# Altium schematic symbol library Minh_Lib.SchLib: 619 symbols (part 4 of 4) (continued)
## TAJB106K020RNJ
designator C?  Supplier Part Number 1: 1354062
钽电容 10uF ±10% 20V 2.1Ω B型3528; Manufacturer: Kyocera AVX; Manufacturer Part Number: TAJB106K020RNJ; Dielectric Material: Tantalum; Tolerance: 20%; ESR (Equivalent Series Resistance): 2.1R; Leakage Current: 2uA; Polarity: Polar; Dissipation Factor: 6%; Q Factor: 6; Supplier 1: RSComponents; RoHS: Yes; Category: Tantalum Capacitors; Stock 1: 240; Pricing 1: 2000=0.12400, 6000=0.11200 (USD); Mount: Surface Mount,PCB; Case/Package: 1210; Number of Pins: 2; Case Code (Metric): 3528; Case Code (Imperial): 1210; Min Operating Temperature: -55°C; Max Operating Temperature: 125°C; Capacitance: 10uF; Voltage Rating (DC): 20V; Voltage Rating: 20V; Package Quantity: 1; Packaging: Tape and Reel; Termination: SMD/SMT; Voltage: 20V; Features: General Purpose; Series: TAJ; Construction: Flat; Length: 3.5mm; Width: 2.8mm; Height: 1.9mm; Depth: 2.8mm; Height - Seated (Max): 0.083inch; Radiation Hardening: No; Lead Free: Lead Free; RoHS Compliant: Yes; REACH SVHC: No SVHC; ComponentLink1URL: https://datasheet.ciiva.com/11793/0900766b80ccdc61-11793072.pdf?src-supplier=RSComponents; ComponentLink1Description: https://datasheet.ciiva.com/11793/0900766b80ccdc61-11793072.pdf?src-supplier=RSComponents; ComponentLink2URL: https://datasheet.ciiva.com/26341/559425-da-01-en-tacc-b-3-2-mm-x-2-5-mm-x-1-9-mm-10-uf-26341766.pdf?src-supplier=Conrad; ComponentLink2Description: https://datasheet.ciiva.com/26341/559425-da-01-en-tacc-b-3-2-mm-x-2-5-mm-x-1-9-mm-10-uf-26341766.pdf?src-supplier=Conrad; ComponentLink3URL: https://datasheet.ciiva.com/26787/tajb106k020rnj-26787086.pdf?src-supplier=IIIC; ComponentLink3Description: https://datasheet.ciiva.com/26787/tajb106k020rnj-26787086.pdf?src-supplier=IIIC; ComponentLink4URL: https://datasheet.ciiva.com/18710/taj-eng-18710633.pdf?src-supplier=Distrelec; ComponentLink4Description: https://datasheet.ciiva.com/18710/taj-eng-18710633.pdf?src-supplier=Distrelec; ComponentLink5URL: https://datasheet.ciiva.com/16485/taj-16485899.pdf?src-supplier=Avnet+Asia; ComponentLink5Description: https://datasheet.ciiva.com/16485/taj-16485899.pdf?src-supplier=Avnet+Asia; ComponentLink6URL: https://datasheet.ciiva.com/16393/taj-16393850.pdf?src-supplier=Future+Electronics; ComponentLink6Description: https://datasheet.ciiva.com/16393/taj-16393850.pdf?src-supplier=Future+Electronics; ComponentLink7URL: https://datasheet.ciiva.com/3004/taj-3004427.pdf?src-supplier=Avnet; ComponentLink7Description: https://datasheet.ciiva.com/3004/taj-3004427.pdf?src-supplier=Avnet; ComponentLink8URL: https://datasheet.ciiva.com/14586/70001050-14586940.pdf?src-supplier=Allied+Electronics; ComponentLink8Description: https://datasheet.ciiva.com/14586/70001050-14586940.pdf?src-supplier=Allied+Electronics; ComponentLink9URL: https://datasheet.ciiva.com/14602/70001050-14602487.pdf?src-supplier=Allied+Electronics; ComponentLink9Description: https://datasheet.ciiva.com/14602/70001050-14602487.pdf?src-supplier=Allied+Electronics; ComponentLink10URL: https://datasheet.ciiva.com/12882/taj-27497-12882702.pdf?src-supplier=Mouser; ComponentLink10Description: https://datasheet.ciiva.com/12882/taj-27497-12882702.pdf?src-supplier=Mouser; ComponentLink11URL: https://datasheet.ciiva.com/263/taj-263492.pdf?src-supplier=Digi-Key; ComponentLink11Description: https://datasheet.ciiva.com/263/taj-263492.pdf?src-supplier=Digi-Key; ComponentLink12URL: https://datasheet.ciiva.com/263/taj-263491.pdf?src-supplier=Digi-Key; ComponentLink12Description: https://datasheet.ciiva.com/263/taj-263491.pdf?src-supplier=Digi-Key; ComponentLink13URL: https://datasheet.ciiva.com/7730/1826076-7730728.pdf?src-supplier=Element14; ComponentLink13Description: https://datasheet.ciiva.com/7730/1826076-7730728.pdf?src-supplier=Element14; ComponentLink14URL: https://datasheet.ciiva.com/5936/13070-5936843.pdf?src-supplier=Farnell; ComponentLink14Description: https://datasheet.ciiva.com/5936/13070-5936843.pdf?src-supplier=Farnell; ComponentLink15URL: https://datasheet.ciiva.com/7730/1826076-7730729.pdf?src-supplier=Element14; ComponentLink15Description: https://datasheet.ciiva.com/7730/1826076-7730729.pdf?src-supplier=Element14; ComponentLink16URL: https://datasheet.ciiva.com/7730/1826076-7730727.pdf?src-supplier=Element14; ComponentLink16Description: https://datasheet.ciiva.com/7730/1826076-7730727.pdf?src-supplier=Element14; ComponentLink17URL: https://datasheet.ciiva.com/7730/1826076-7730726.pdf?src-supplier=Element14; ComponentLink17Description: https://datasheet.ciiva.com/7730/1826076-7730726.pdf?src-supplier=Element14; ComponentLink18URL: https://datasheet.ciiva.com/263/taj-263490.pdf?src-supplier=Digi-Key; ComponentLink18Description: https://datasheet.ciiva.com/263/taj-263490.pdf?src-supplier=Digi-Key; ComponentLink19URL: https://datasheet.ciiva.com/3004/taj-3004426.pdf?src-supplier=Avnet; ComponentLink19Description: https://datasheet.ciiva.com/3004/taj-3004426.pdf?src-supplier=Avnet
footprint Capacitor/Tantalum  - SMD3528/B - AVX (1210/3528-15 SIZE B-AVX)
pins: 1, 2
text: +

## TAJB106K025RNJ
designator C?  Supplier Part Number 1: 1360159
钽电容 10uF ±10% 25V 2.5Ω B型3528; Manufacturer: Kyocera AVX; Manufacturer Part Number: TAJB106K025RNJ; ESR (Equivalent Series Resistance): 2.5R; Leakage Current: 2.5uA; Polarity: Polar; Dissipation Factor: 6%; Supplier 1: RSComponents; RoHS: Yes; Category: Tantalum Capacitors; Stock 1: 1; Pricing 1: 20=0.51000, 100=0.49000, 200=0.46800, 500=0.42200, 1000=0.37700 (USD); Mount: Surface Mount; Case/Package: 1210; Case Code (Metric): 3528; Case Code (Imperial): 1210; Weight: 0.000564oz; Min Operating Temperature: -55°C; Max Operating Temperature: 125°C; Capacitance: 10uF; Tolerance: 10%; Packaging: Tape and Reel; Voltage Rating: 25V; Package Quantity: 1; Termination: SMD/SMT; Voltage Rating (DC): 25V; Features: General Purpose; Series: TAJ; Construction: Flat; Length: 3.5mm; Width: 0.11inch; Height: 2.1mm; Depth: 2.8mm; Height - Seated (Max): 0.083inch; Radiation Hardening: No; REACH SVHC: No SVHC; Lead Free: Lead Free; RoHS Compliant: Yes; ComponentLink1URL: https://datasheet.ciiva.com/22666/1719052-22666911.pdf?src-supplier=Element14; ComponentLink1Description: https://datasheet.ciiva.com/22666/1719052-22666911.pdf?src-supplier=Element14; ComponentLink2URL: https://datasheet.ciiva.com/28447/1719052-28447723.pdf?src-supplier=Element14; ComponentLink2Description: https://datasheet.ciiva.com/28447/1719052-28447723.pdf?src-supplier=Element14; ComponentLink3URL: https://datasheet.ciiva.com/28608/1719052-28608983.pdf?src-supplier=Element14; ComponentLink3Description: https://datasheet.ciiva.com/28608/1719052-28608983.pdf?src-supplier=Element14; ComponentLink4URL: https://datasheet.ciiva.com/263/taj-263772.pdf?src-supplier=Digi-Key; ComponentLink4Description: https://datasheet.ciiva.com/263/taj-263772.pdf?src-supplier=Digi-Key; ComponentLink5URL: https://datasheet.ciiva.com/263/taj-263771.pdf?src-supplier=Digi-Key; ComponentLink5Description: https://datasheet.ciiva.com/263/taj-263771.pdf?src-supplier=Digi-Key; ComponentLink6URL: https://datasheet.ciiva.com/263/taj-263773.pdf?src-supplier=Digi-Key; ComponentLink6Description: https://datasheet.ciiva.com/263/taj-263773.pdf?src-supplier=Digi-Key; ComponentLink7URL: https://datasheet.ciiva.com/12911/taj-27497-12911407.pdf?src-supplier=Mouser; ComponentLink7Description: https://datasheet.ciiva.com/12911/taj-27497-12911407.pdf?src-supplier=Mouser; ComponentLink8URL: https://datasheet.ciiva.com/11222/taj-11222104.pdf?src-supplier=Avnet; ComponentLink8Description: https://datasheet.ciiva.com/11222/taj-11222104.pdf?src-supplier=Avnet; ComponentLink9URL: https://datasheet.ciiva.com/16492/taj-16492839.pdf?src-supplier=Future+Electronics; ComponentLink9Description: https://datasheet.ciiva.com/16492/taj-16492839.pdf?src-supplier=Future+Electronics
footprint Capacitor/Tantalum  - SMD3528/B - AVX (1210/3528-15 SIZE B-AVX)
pins: 1, 2
text: +

## TAJB107K002RNJ
designator C?  Supplier Part Number 1: 581-TAJB107K002RNJ
钽电容 100uF ±10% 2.5V 1.4Ω B型3528; Manufacturer: Kyocera AVX; Manufacturer Part Number: TAJB107K002RNJ; Dielectric Material: Tantalum; ESR (Equivalent Series Resistance): 1.4R; Leakage Current: 2.5uA; Polarity: Polar; Dissipation Factor: 8%; Supplier 1: Mouser; RoHS: Yes; Category: Tantalum Capacitors; Stock 1: 1702; Pricing 1: 1=1.27000, 10=1.01000, 50=1.01000, 100=0.75200, 1000=0.46500, 10000=0.41100 (USD); Mount: Surface Mount; Case/Package: 1210; Case Code (Metric): 3528; Case Code (Imperial): 1210; Min Operating Temperature: -55°C; Max Operating Temperature: 125°C; Capacitance: 100uF; Tolerance: 10%; Voltage Rating: 2.5V; Package Quantity: 2000; Packaging: Tape and Reel; Termination: SMD/SMT; Voltage Rating (DC): 2.5V; Features: General Purpose; Series: TAJ; Construction: Flat; Length: 3.5mm; Width: 0.11inch; Height: 2.1mm; Height - Seated (Max): 0.083inch; Depth: 2.8mm; Radiation Hardening: No; REACH SVHC: No SVHC; Lead Free: Lead Free; RoHS Compliant: Yes; ComponentLink1URL: https://datasheet.ciiva.com/6002/84652-6002288.pdf?src-supplier=Farnell; ComponentLink1Description: https://datasheet.ciiva.com/6002/84652-6002288.pdf?src-supplier=Farnell; ComponentLink2URL: https://datasheet.ciiva.com/7720/84652-7720601.pdf?src-supplier=Element14; ComponentLink2Description: https://datasheet.ciiva.com/7720/84652-7720601.pdf?src-supplier=Element14; ComponentLink3URL: https://datasheet.ciiva.com/7720/84652-7720602.pdf?src-supplier=Element14; ComponentLink3Description: https://datasheet.ciiva.com/7720/84652-7720602.pdf?src-supplier=Element14; ComponentLink4URL: https://datasheet.ciiva.com/12885/taj-27497-12885743.pdf?src-supplier=Mouser; ComponentLink4Description: https://datasheet.ciiva.com/12885/taj-27497-12885743.pdf?src-supplier=Mouser; ComponentLink5URL: https://datasheet.ciiva.com/11226/taj-11226679.pdf?src-supplier=Avnet; ComponentLink5Description: https://datasheet.ciiva.com/11226/taj-11226679.pdf?src-supplier=Avnet; ComponentLink6URL: https://datasheet.ciiva.com/282/taj-282577.pdf?src-supplier=Digi-Key; ComponentLink6Description: https://datasheet.ciiva.com/282/taj-282577.pdf?src-supplier=Digi-Key
footprint Capacitor/Tantalum  - SMD3528/B - AVX (1210/3528-15 SIZE B-AVX)
pins: 1, 2
text: +

## TAJB107K004RNJ
designator C?  Supplier Part Number 1: 94W9649
钽电容 100uF ±10% 4V 0.9Ω B型3528; Manufacturer: Kyocera AVX; Manufacturer Part Number: TAJB107K004RNJ; Dielectric Material: Tantalum; ESR (Equivalent Series Resistance): 900mR; Leakage Current: 4uA; Polarity: Polar; Dissipation Factor: 8%; Supplier 1: Newark; RoHS: Yes; Category: Tantalum Capacitors; Stock 1: 4000; Pricing 1: 1=0.30200, 2000=0.30200 (USD); Mount: Surface Mount; Case/Package: 1210; Case Code (Metric): 3528; Case Code (Imperial): 1210; Min Operating Temperature: -55°C; Max Operating Temperature: 125°C; Capacitance: 100uF; Tolerance: 10%; Package Quantity: 1; Voltage Rating: 4V; Packaging: Tape and Reel; Termination: SMD/SMT; Features: General Purpose; Series: TAJ; Construction: Flat; Length: 3.5mm; Width: 0.11inch; Height: 1.9mm; Depth: 2.8mm; Height - Seated (Max): 0.083inch; Radiation Hardening: No; REACH SVHC: No SVHC; Lead Free: Lead Free; RoHS Compliant: Yes; ComponentLink1URL: https://datasheet.ciiva.com/26341/559426-da-01-en-tacc-b-3-2-mm-x-2-5-mm-x-1-9-mm-100-uf-26341765.pdf?src-supplier=Conrad; ComponentLink1Description: https://datasheet.ciiva.com/26341/559426-da-01-en-tacc-b-3-2-mm-x-2-5-mm-x-1-9-mm-100-uf-26341765.pdf?src-supplier=Conrad; ComponentLink2URL: https://datasheet.ciiva.com/7720/1680476-7720605.pdf?src-supplier=Element14; ComponentLink2Description: https://datasheet.ciiva.com/7720/1680476-7720605.pdf?src-supplier=Element14; ComponentLink3URL: https://datasheet.ciiva.com/7720/1680476-7720603.pdf?src-supplier=Element14; ComponentLink3Description: https://datasheet.ciiva.com/7720/1680476-7720603.pdf?src-supplier=Element14; ComponentLink4URL: https://datasheet.ciiva.com/7720/1680476-7720604.pdf?src-supplier=Element14; ComponentLink4Description: https://datasheet.ciiva.com/7720/1680476-7720604.pdf?src-supplier=Element14; ComponentLink5URL: https://datasheet.ciiva.com/264/taj-264131.pdf?src-supplier=Digi-Key; ComponentLink5Description: https://datasheet.ciiva.com/264/taj-264131.pdf?src-supplier=Digi-Key; ComponentLink6URL: https://datasheet.ciiva.com/264/taj-264130.pdf?src-supplier=Digi-Key; ComponentLink6Description: https://datasheet.ciiva.com/264/taj-264130.pdf?src-supplier=Digi-Key; ComponentLink7URL: https://datasheet.ciiva.com/264/taj-264132.pdf?src-supplier=Digi-Key; ComponentLink7Description: https://datasheet.ciiva.com/264/taj-264132.pdf?src-supplier=Digi-Key; ComponentLink8URL: https://datasheet.ciiva.com/12882/taj-27497-12882981.pdf?src-supplier=Mouser; ComponentLink8Description: https://datasheet.ciiva.com/12882/taj-27497-12882981.pdf?src-supplier=Mouser; ComponentLink9URL: https://datasheet.ciiva.com/11228/taj-11228540.pdf?src-supplier=Avnet; ComponentLink9Description: https://datasheet.ciiva.com/11228/taj-11228540.pdf?src-supplier=Avnet; ComponentLink10URL: https://datasheet.ciiva.com/15225/getdatasheetpartid-117177-15225579.pdf?src-supplier=Verical; ComponentLink10Description: https://datasheet.ciiva.com/15225/getdatasheetpartid-117177-15225579.pdf?src-supplier=Verical; ComponentLink11URL: https://datasheet.ciiva.com/11228/taj-11228539.pdf?src-supplier=Avnet; ComponentLink11Description: https://datasheet.ciiva.com/11228/taj-11228539.pdf?src-supplier=Avnet
footprint Capacitor/Tantalum  - SMD3528/B - AVX (1210/3528-15 SIZE B-AVX)
pins: 1, 2
text: +

## TAJB107K006RNJ
designator C?  Supplier Part Number 1: 02P5707
钽电容 100uF ±10% 6.3V 1.7Ω B型3528; Manufacturer: Kyocera AVX; Manufacturer Part Number: TAJB107K006RNJ; Dielectric Material: Tantalum; ESR (Equivalent Series Resistance): 1.7R; Leakage Current: 6.3uA; Polarity: Polar; Supplier 1: Newark; RoHS: Yes; Category: Tantalum Capacitors; Mount: Surface Mount,PCB; Case/Package: 1210; Case Code (Imperial): 1210; Case Code (Metric): 3528; Min Operating Temperature: -55°C; Max Operating Temperature: 125°C; Capacitance: 100uF; Tolerance: 10%; Packaging: Tape and Reel; Voltage Rating (DC): 6.3V; Voltage: 6.3V; Voltage Rating: 6.3V; Package Quantity: 1; Termination: SMD/SMT; Dissipation Factor: 10%; Features: General Purpose; Series: TAJ; Construction: Flat; Length: 3.5mm; Width: 2.8mm; Height: 1.9mm; Depth: 2.8mm; Height - Seated (Max): 0.083inch; Radiation Hardening: No; REACH SVHC: No SVHC; Lead Free: Lead Free; RoHS Compliant: Yes; ComponentLink1URL: https://datasheet.ciiva.com/11794/0900766b802e69d0-11794415.pdf?src-supplier=RSComponents; ComponentLink1Description: https://datasheet.ciiva.com/11794/0900766b802e69d0-11794415.pdf?src-supplier=RSComponents; ComponentLink2URL: https://datasheet.ciiva.com/26915/getdatasheetpartid-133381-26915174.pdf?src-supplier=Verical; ComponentLink2Description: https://datasheet.ciiva.com/26915/getdatasheetpartid-133381-26915174.pdf?src-supplier=Verical; ComponentLink3URL: https://datasheet.ciiva.com/18710/taj-eng-18710634.pdf?src-supplier=Distrelec; ComponentLink3Description: https://datasheet.ciiva.com/18710/taj-eng-18710634.pdf?src-supplier=Distrelec; ComponentLink4URL: https://datasheet.ciiva.com/7720/1680476-7720606.pdf?src-supplier=Element14; ComponentLink4Description: https://datasheet.ciiva.com/7720/1680476-7720606.pdf?src-supplier=Element14; ComponentLink5URL: https://datasheet.ciiva.com/7720/1680476-7720607.pdf?src-supplier=Element14; ComponentLink5Description: https://datasheet.ciiva.com/7720/1680476-7720607.pdf?src-supplier=Element14; ComponentLink6URL: https://datasheet.ciiva.com/264/taj-264188.pdf?src-supplier=Digi-Key; ComponentLink6Description: https://datasheet.ciiva.com/264/taj-264188.pdf?src-supplier=Digi-Key; ComponentLink7URL: https://datasheet.ciiva.com/264/taj-264187.pdf?src-supplier=Digi-Key; ComponentLink7Description: https://datasheet.ciiva.com/264/taj-264187.pdf?src-supplier=Digi-Key; ComponentLink8URL: https://datasheet.ciiva.com/264/taj-264189.pdf?src-supplier=Digi-Key; ComponentLink8Description: https://datasheet.ciiva.com/264/taj-264189.pdf?src-supplier=Digi-Key; ComponentLink9URL: https://datasheet.ciiva.com/14602/70001050-14602126.pdf?src-supplier=Allied+Electronics; ComponentLink9Description: https://datasheet.ciiva.com/14602/70001050-14602126.pdf?src-supplier=Allied+Electronics; ComponentLink10URL: https://datasheet.ciiva.com/14599/70001050-14599717.pdf?src-supplier=Allied+Electronics; ComponentLink10Description: https://datasheet.ciiva.com/14599/70001050-14599717.pdf?src-supplier=Allied+Electronics; ComponentLink11URL: https://datasheet.ciiva.com/11224/taj-11224955.pdf?src-supplier=Avnet; ComponentLink11Description: https://datasheet.ciiva.com/11224/taj-11224955.pdf?src-supplier=Avnet; ComponentLink12URL: https://datasheet.ciiva.com/16632/taj-16632597.pdf?src-supplier=Avnet+Europe; ComponentLink12Description: https://datasheet.ciiva.com/16632/taj-16632597.pdf?src-supplier=Avnet+Europe
footprint Capacitor/Tantalum  - SMD3528/B - AVX (1210/3528-15 SIZE B-AVX)
pins: 1, 2
text: +

## TAJB107K010RNJ
designator C?  Supplier Part Number 1: 478-TAJB107K010RNJCT-ND
钽电容 100uF ±10% 10V 1.4Ω B型3528; Manufacturer: Kyocera AVX; Manufacturer Part Number: TAJB107K010RNJ; ESR (Equivalent Series Resistance): 1.4R; Supplier 1: Digi-Key; RoHS: Yes; Category: Tantalum Capacitors; Stock 1: 696; Pricing 1: 1=0.77000, 10=0.58500, 50=0.48600, 100=0.41850, 500=0.32400, 1000=0.27900 (USD); Case/Package: Molded; Min Operating Temperature: -55°C; Max Operating Temperature: 125°C; Capacitance: 100uF; Tolerance: 10%; Voltage Rating (DC): 10V; Construction: Flat; Length: 3.5mm; Height: 1.9mm; Depth: 2.8mm; Radiation Hardening: No; Lead Free: Lead Free; RoHS Compliant: Yes; ComponentLink1URL: https://datasheet.ciiva.com/11226/taj-11226106.pdf?src-supplier=Avnet; ComponentLink1Description: https://datasheet.ciiva.com/11226/taj-11226106.pdf?src-supplier=Avnet
footprint Capacitor/Tantalum  - SMD3528/B - AVX (1210/3528-15 SIZE B-AVX)
pins: 1, 2
text: +

## TAJB154K050RNJ
designator C?  Supplier Part Number 1: 54J3048
钽电容 150nF ±10% 50V 17Ω B型3528; Manufacturer: Kyocera AVX; Manufacturer Part Number: TAJB154K050RNJ; Dielectric Material: Tantalum; ESR (Equivalent Series Resistance): 17R; Leakage Current: 500nA; Polarity: Polar; Dissipation Factor: 4%; Q Factor: 4; Supplier 1: Newark; RoHS: Yes; Category: Tantalum Capacitors; Pricing 1: 2000=0.44200 (USD); Mount: Surface Mount; Case/Package: 1210; Number of Pins: 2; Case Code (Imperial): 1210; Case Code (Metric): 3528; Weight: 0.000564oz; Min Operating Temperature: -55°C; Max Operating Temperature: 125°C; Tolerance: 10%; Capacitance: 150nF; Packaging: Tape and Reel; Voltage Rating: 50V; Package Quantity: 2000; Termination: SMD/SMT; Voltage Rating (DC): 50V; Features: General Purpose; Series: TAJ; Construction: Flat; Length: 3.5mm; Width: 2.8mm; Height: 2.1mm; Depth: 2.8mm; Height - Seated (Max): 0.083inch; Radiation Hardening: No; Lead Free: Lead Free; RoHS Compliant: Yes; ComponentLink1URL: https://datasheet.ciiva.com/12908/taj-27497-12908693.pdf?src-supplier=Mouser; ComponentLink1Description: https://datasheet.ciiva.com/12908/taj-27497-12908693.pdf?src-supplier=Mouser; ComponentLink2URL: https://datasheet.ciiva.com/17337/taj-17337118.pdf?src-supplier=Avnet+Europe; ComponentLink2Description: https://datasheet.ciiva.com/17337/taj-17337118.pdf?src-supplier=Avnet+Europe; ComponentLink3URL: https://datasheet.ciiva.com/283/taj-283433.pdf?src-supplier=Digi-Key; ComponentLink3Description: https://datasheet.ciiva.com/283/taj-283433.pdf?src-supplier=Digi-Key
footprint Capacitor/Tantalum  - SMD3528/B - AVX (1210/3528-15 SIZE B-AVX)
pins: 1, 2
text: +

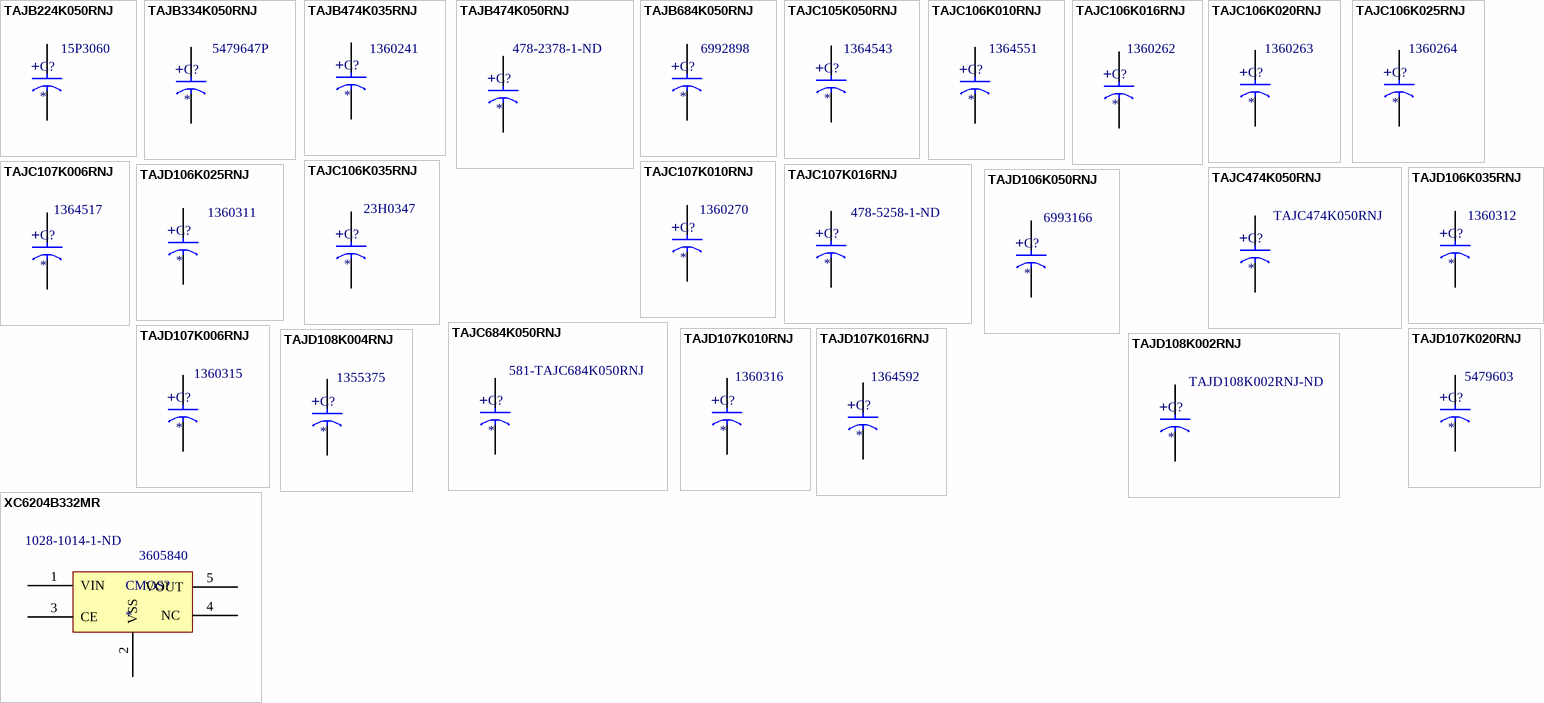
[diagram p15: symbols TAJB224K050RNJ to XC6204B332MR]

## TAJB224K050RNJ
designator C?  Supplier Part Number 1: 15P3060
钽电容 220nF ±10% 50V 14Ω B型3528; Manufacturer: Kyocera AVX; Manufacturer Part Number: TAJB224K050RNJ; Dielectric Material: Tantalum; ESR (Equivalent Series Resistance): 14R; Leakage Current: 500nA; Polarity: Polar; Dissipation Factor: 4%; Q Factor: 4; Supplier 1: Newark; RoHS: Yes; Category: Tantalum Capacitors; Stock 1: 820; Pricing 1: 1=1.38000, 5=1.38000, 10=1.10000, 25=1.01000, 50=0.92500, 100=0.83500 (USD); Mount: Surface Mount; Case/Package: 1210; Number of Pins: 2; Case Code (Metric): 3528; Case Code (Imperial): 1210; Min Operating Temperature: -55°C; Max Operating Temperature: 125°C; Capacitance: 220nF; Tolerance: 10%; Voltage Rating: 50V; Package Quantity: 2000; Packaging: Tape and Reel; Termination: SMD/SMT; Voltage Rating (DC): 50V; Features: General Purpose; Series: TAJ; Construction: Flat; Length: 3.5mm; Width: 0.11inch; Height: 2.1mm; Depth: 2.8mm; Height - Seated (Max): 0.083inch; Radiation Hardening: No; REACH SVHC: No SVHC; Lead Free: Lead Free; RoHS Compliant: Yes; ComponentLink1URL: https://datasheet.ciiva.com/12890/taj-27497-12890447.pdf?src-supplier=Mouser; ComponentLink1Description: https://datasheet.ciiva.com/12890/taj-27497-12890447.pdf?src-supplier=Mouser; ComponentLink2URL: https://datasheet.ciiva.com/11217/taj-11217546.pdf?src-supplier=Avnet; ComponentLink2Description: https://datasheet.ciiva.com/11217/taj-11217546.pdf?src-supplier=Avnet; ComponentLink3URL: https://datasheet.ciiva.com/283/taj-283434.pdf?src-supplier=Digi-Key; ComponentLink3Description: https://datasheet.ciiva.com/283/taj-283434.pdf?src-supplier=Digi-Key
footprint Capacitor/Tantalum  - SMD3528/B - AVX (1210/3528-15 SIZE B-AVX)
pins: 1, 2
text: +

## TAJB334K050RNJ
designator C?  Supplier Part Number 1: 5479647P
钽电容 330nF ±10% 50V 12Ω B型3528; Manufacturer: Kyocera AVX; Manufacturer Part Number: TAJB334K050RNJ; Dielectric Material: Tantalum; ESR (Equivalent Series Resistance): 12R; Leakage Current: 500nA; Polarity: Polar; Dissipation Factor: 4%; Q Factor: 4; Supplier 1: RSComponents; RoHS: Yes; Category: Tantalum Capacitors; Stock 1: 1; Pricing 1: 25=0.61200, 100=0.56200, 250=0.49900, 500=0.44700, 1000=0.38500 (USD); Mount: Surface Mount; Case/Package: 1210; Number of Pins: 2; Case Code (Metric): 3528; Case Code (Imperial): 1210; Min Operating Temperature: -55°C; Max Operating Temperature: 125°C; Capacitance: 330nF; Tolerance: 10%; Packaging: Tape and Reel; Package Quantity: 1; Voltage Rating: 50V; Voltage Rating (DC): 50V; Termination: SMD/SMT; Voltage: 50V; Features: General Purpose; Series: TAJ; Construction: Flat; Length: 3.5mm; Width: 2.8mm; Height: 1.9mm; Depth: 2.8mm; Height - Seated (Max): 0.083inch; Radiation Hardening: No; REACH SVHC: No SVHC; Lead Free: Lead Free; RoHS Compliant: Yes; ComponentLink1URL: https://datasheet.ciiva.com/11794/0900766b802e69d0-11794416.pdf?src-supplier=RSComponents; ComponentLink1Description: https://datasheet.ciiva.com/11794/0900766b802e69d0-11794416.pdf?src-supplier=RSComponents; ComponentLink2URL: https://datasheet.ciiva.com/7853/1680476-7853125.pdf?src-supplier=Element14; ComponentLink2Description: https://datasheet.ciiva.com/7853/1680476-7853125.pdf?src-supplier=Element14; ComponentLink3URL: https://datasheet.ciiva.com/28564/taj-28564037.pdf?src-supplier=Element14; ComponentLink3Description: https://datasheet.ciiva.com/28564/taj-28564037.pdf?src-supplier=Element14; ComponentLink4URL: https://datasheet.ciiva.com/264/taj-264308.pdf?src-supplier=Digi-Key; ComponentLink4Description: https://datasheet.ciiva.com/264/taj-264308.pdf?src-supplier=Digi-Key; ComponentLink5URL: https://datasheet.ciiva.com/264/taj-264307.pdf?src-supplier=Digi-Key; ComponentLink5Description: https://datasheet.ciiva.com/264/taj-264307.pdf?src-supplier=Digi-Key; ComponentLink6URL: https://datasheet.ciiva.com/264/taj-264309.pdf?src-supplier=Digi-Key; ComponentLink6Description: https://datasheet.ciiva.com/264/taj-264309.pdf?src-supplier=Digi-Key; ComponentLink7URL: https://datasheet.ciiva.com/12883/taj-27497-12883007.pdf?src-supplier=Mouser; ComponentLink7Description: https://datasheet.ciiva.com/12883/taj-27497-12883007.pdf?src-supplier=Mouser; ComponentLink8URL: https://datasheet.ciiva.com/16370/taj-16370910.pdf?src-supplier=Future+Electronics; ComponentLink8Description: https://datasheet.ciiva.com/16370/taj-16370910.pdf?src-supplier=Future+Electronics; ComponentLink9URL: https://datasheet.ciiva.com/17337/taj-17337189.pdf?src-supplier=Avnet+Europe; ComponentLink9Description: https://datasheet.ciiva.com/17337/taj-17337189.pdf?src-supplier=Avnet+Europe
footprint Capacitor/Tantalum  - SMD3528/B - AVX (1210/3528-15 SIZE B-AVX)
pins: 1, 2
text: +

## TAJB474K035RNJ
designator C?  Supplier Part Number 1: 1360241
钽电容 470nF ±10% 35V 10Ω B型3528; Manufacturer: Kyocera AVX; Manufacturer Part Number: TAJB474K035RNJ; Dielectric Material: Tantalum; ESR (Equivalent Series Resistance): 10R; Leakage Current: 500nA; Polarity: Polar; Dissipation Factor: 4%; Q Factor: 4; Supplier 1: RSComponents; RoHS: Yes; Category: Tantalum Capacitors; Stock 1: 48; Pricing 1: 2000=0.14300 (USD); Mount: Surface Mount; Case/Package: 1210; Case Code (Imperial): 1210; Case Code (Metric): 3528; Min Operating Temperature: -55°C; Max Operating Temperature: 125°C; Capacitance: 470nF; Tolerance: 10%; Voltage Rating: 35V; Package Quantity: 2000; Packaging: Tape and Reel; Termination: SMD/SMT; Voltage: 35V; Features: General Purpose; Series: TAJ; Construction: Flat; Length: 3.5mm; Width: 2.8mm; Height: 1.9mm; Depth: 2.8mm; Height - Seated (Max): 0.083inch; Radiation Hardening: No; REACH SVHC: No SVHC; Lead Free: Lead Free; RoHS Compliant: Yes; ComponentLink1URL: https://datasheet.ciiva.com/11793/0900766b80ccdc61-11793561.pdf?src-supplier=RSComponents; ComponentLink1Description: https://datasheet.ciiva.com/11793/0900766b80ccdc61-11793561.pdf?src-supplier=RSComponents; ComponentLink2URL: https://datasheet.ciiva.com/7853/1826076-7853128.pdf?src-supplier=Element14; ComponentLink2Description: https://datasheet.ciiva.com/7853/1826076-7853128.pdf?src-supplier=Element14; ComponentLink3URL: https://datasheet.ciiva.com/7853/1826076-7853127.pdf?src-supplier=Element14; ComponentLink3Description: https://datasheet.ciiva.com/7853/1826076-7853127.pdf?src-supplier=Element14; ComponentLink4URL: https://datasheet.ciiva.com/7853/1826076-7853126.pdf?src-supplier=Element14; ComponentLink4Description: https://datasheet.ciiva.com/7853/1826076-7853126.pdf?src-supplier=Element14; ComponentLink5URL: https://datasheet.ciiva.com/28564/taj-28564041.pdf?src-supplier=Element14; ComponentLink5Description: https://datasheet.ciiva.com/28564/taj-28564041.pdf?src-supplier=Element14; ComponentLink6URL: https://datasheet.ciiva.com/266/taj-266398.pdf?src-supplier=Digi-Key; ComponentLink6Description: https://datasheet.ciiva.com/266/taj-266398.pdf?src-supplier=Digi-Key; ComponentLink7URL: https://datasheet.ciiva.com/266/taj-266397.pdf?src-supplier=Digi-Key; ComponentLink7Description: https://datasheet.ciiva.com/266/taj-266397.pdf?src-supplier=Digi-Key; ComponentLink8URL: https://datasheet.ciiva.com/266/taj-266399.pdf?src-supplier=Digi-Key; ComponentLink8Description: https://datasheet.ciiva.com/266/taj-266399.pdf?src-supplier=Digi-Key; ComponentLink9URL: https://datasheet.ciiva.com/12884/taj-27497-12884885.pdf?src-supplier=Mouser; ComponentLink9Description: https://datasheet.ciiva.com/12884/taj-27497-12884885.pdf?src-supplier=Mouser; ComponentLink10URL: https://datasheet.ciiva.com/11218/taj-11218183.pdf?src-supplier=Avnet; ComponentLink10Description: https://datasheet.ciiva.com/11218/taj-11218183.pdf?src-supplier=Avnet; ComponentLink11URL: https://datasheet.ciiva.com/17337/taj-17337226.pdf?src-supplier=Avnet+Europe; ComponentLink11Description: https://datasheet.ciiva.com/17337/taj-17337226.pdf?src-supplier=Avnet+Europe
footprint Capacitor/Tantalum  - SMD3528/B - AVX (1210/3528-15 SIZE B-AVX)
pins: 1, 2
text: +

## TAJB474K050RNJ
designator C?  Supplier Part Number 1: 478-2378-1-ND
钽电容 470nF ±10% 50V 9.5Ω B型3528; Manufacturer: Kyocera AVX; Manufacturer Part Number: TAJB474K050RNJ; Dielectric Material: Tantalum; ESR (Equivalent Series Resistance): 9.5R; Leakage Current: 700nA; Polarity: Polar; Dissipation Factor: 4%; Supplier 1: Digi-Key; RoHS: Yes; Category: Tantalum Capacitors; Stock 1: 3534; Pricing 1: 1=0.75000, 10=0.53300, 50=0.40320, 100=0.35120, 500=0.26012, 1000=0.22111 (USD); Mount: Surface Mount; Case/Package: 1210; Number of Pins: 2; Case Code (Imperial): 1210; Case Code (Metric): 3528; Min Operating Temperature: -55°C; Max Operating Temperature: 125°C; Capacitance: 470nF; Package Quantity: 1; Voltage Rating: 50V; Tolerance: 10%; Packaging: Tape and Reel; Voltage Rating (DC): 50V; Termination: SMD/SMT; Features: General Purpose; Series: TAJ; Construction: Flat; Length: 3.5mm; Width: 2.8mm; Height: 2.1mm; Height - Seated (Max): 0.083inch; Depth: 2.8mm; Lead Pitch: 1.4mm; Radiation Hardening: No; REACH SVHC: No SVHC; Lead Free: Lead Free; RoHS Compliant: Yes; ComponentLink1URL: https://datasheet.ciiva.com/7853/49917-7853130.pdf?src-supplier=Element14; ComponentLink1Description: https://datasheet.ciiva.com/7853/49917-7853130.pdf?src-supplier=Element14; ComponentLink2URL: https://datasheet.ciiva.com/7853/49917-7853129.pdf?src-supplier=Element14; ComponentLink2Description: https://datasheet.ciiva.com/7853/49917-7853129.pdf?src-supplier=Element14; ComponentLink3URL: https://datasheet.ciiva.com/264/taj-264314.pdf?src-supplier=Digi-Key; ComponentLink3Description: https://datasheet.ciiva.com/264/taj-264314.pdf?src-supplier=Digi-Key; ComponentLink4URL: https://datasheet.ciiva.com/264/taj-264313.pdf?src-supplier=Digi-Key; ComponentLink4Description: https://datasheet.ciiva.com/264/taj-264313.pdf?src-supplier=Digi-Key; ComponentLink5URL: https://datasheet.ciiva.com/264/taj-264315.pdf?src-supplier=Digi-Key; ComponentLink5Description: https://datasheet.ciiva.com/264/taj-264315.pdf?src-supplier=Digi-Key; ComponentLink6URL: https://datasheet.ciiva.com/11218/taj-11218590.pdf?src-supplier=Avnet; ComponentLink6Description: https://datasheet.ciiva.com/11218/taj-11218590.pdf?src-supplier=Avnet; ComponentLink7URL: https://datasheet.ciiva.com/16492/taj-16492840.pdf?src-supplier=Future+Electronics; ComponentLink7Description: https://datasheet.ciiva.com/16492/taj-16492840.pdf?src-supplier=Future+Electronics
footprint Capacitor/Tantalum  - SMD3528/B - AVX (1210/3528-15 SIZE B-AVX)
pins: 1, 2
text: +

## TAJB684K050RNJ
designator C?  Supplier Part Number 1: 6992898
钽电容 680nF ±10% 50V 8Ω B型3528; Manufacturer: Kyocera AVX; Manufacturer Part Number: TAJB684K050RNJ; Dielectric Material: Tantalum; ESR (Equivalent Series Resistance): 8R; Leakage Current: 500nA; Polarity: Polar; Dissipation Factor: 4%; Supplier 1: RSComponents; RoHS: Yes; Category: Tantalum Capacitors; Stock 1: 1; Pricing 1: 5=0.08900 (USD); Mount: Surface Mount; Case/Package: 1210; Number of Pins: 2; Case Code (Metric): 3528; Case Code (Imperial): 1210; Weight: 0.000564oz; Min Operating Temperature: -55°C; Max Operating Temperature: 125°C; Tolerance: 10%; Packaging: Tape and Reel; Package Quantity: 1; Capacitance: 680nF; Voltage Rating: 50V; Termination: SMD/SMT; Voltage Rating (DC): 50V; Features: General Purpose; Series: TAJ; Construction: Flat; Length: 3.5mm; Width: 0.11inch; Height: 2.1mm; Height - Seated (Max): 0.083inch; Depth: 2.8mm; Radiation Hardening: No; Lead Free: Lead Free; RoHS Compliant: Yes; ComponentLink1URL: https://datasheet.ciiva.com/264/taj-264311.pdf?src-supplier=Digi-Key; ComponentLink1Description: https://datasheet.ciiva.com/264/taj-264311.pdf?src-supplier=Digi-Key; ComponentLink2URL: https://datasheet.ciiva.com/264/taj-264310.pdf?src-supplier=Digi-Key; ComponentLink2Description: https://datasheet.ciiva.com/264/taj-264310.pdf?src-supplier=Digi-Key; ComponentLink3URL: https://datasheet.ciiva.com/264/taj-264312.pdf?src-supplier=Digi-Key; ComponentLink3Description: https://datasheet.ciiva.com/264/taj-264312.pdf?src-supplier=Digi-Key; ComponentLink4URL: https://datasheet.ciiva.com/12908/taj-27497-12908889.pdf?src-supplier=Mouser; ComponentLink4Description: https://datasheet.ciiva.com/12908/taj-27497-12908889.pdf?src-supplier=Mouser; ComponentLink5URL: https://datasheet.ciiva.com/11218/taj-11218650.pdf?src-supplier=Avnet; ComponentLink5Description: https://datasheet.ciiva.com/11218/taj-11218650.pdf?src-supplier=Avnet; ComponentLink6URL: https://datasheet.ciiva.com/16492/taj-16492889.pdf?src-supplier=Future+Electronics; ComponentLink6Description: https://datasheet.ciiva.com/16492/taj-16492889.pdf?src-supplier=Future+Electronics; ComponentLink7URL: https://datasheet.ciiva.com/17343/taj-17343819.pdf?src-supplier=Avnet+Europe; ComponentLink7Description: https://datasheet.ciiva.com/17343/taj-17343819.pdf?src-supplier=Avnet+Europe
footprint Capacitor/Tantalum  - SMD3528/B - AVX (1210/3528-15 SIZE B-AVX)
pins: 1, 2
text: +

## TAJC105K050RNJ
designator C?  Supplier Part Number 1: 1364543
钽电容 1uF ±10% 50V 5.5Ω C型6032; Manufacturer: Kyocera AVX; Manufacturer Part Number: TAJC105K050RNJ; Dielectric Material: Tantalum; ESR (Equivalent Series Resistance): 5.5R; Leakage Current: 500nA; Polarity: Polar; Dissipation Factor: 4%; Supplier 1: RSComponents; RoHS: Yes; Category: Tantalum Capacitors; Stock 1: 1; Pricing 1: 20=0.70200, 100=0.50800, 400=0.48300, 1000=0.41800 (USD); Mount: Surface Mount,PCB; Case/Package: Molded; Number of Pins: 2; Case Code (Metric): 6032; Case Code (Imperial): 2312; Weight: 0.005291oz; Min Operating Temperature: -55°C; Max Operating Temperature: 125°C; Capacitance: 1uF; Tolerance: 10%; Voltage Rating: 50V; Voltage Rating (DC): 50V; Packaging: Tape and Reel; Package Quantity: 1; Termination: SMD/SMT; Voltage: 50V; Features: General Purpose; Series: TAJ; Construction: Flat; Length: 6mm; Width: 3.2mm; Height: 2.6mm; Depth: 3.2mm; Height - Seated (Max): 0.11inch; Radiation Hardening: No; REACH SVHC: No SVHC; Lead Free: Lead Free; RoHS Compliant: Yes; ComponentLink1URL: https://datasheet.ciiva.com/11794/0900766b802e69d0-11794410.pdf?src-supplier=RSComponents; ComponentLink1Description: https://datasheet.ciiva.com/11794/0900766b802e69d0-11794410.pdf?src-supplier=RSComponents; ComponentLink2URL: https://datasheet.ciiva.com/26944/getdatasheetpartid-139067-26944822.pdf?src-supplier=Verical; ComponentLink2Description: https://datasheet.ciiva.com/26944/getdatasheetpartid-139067-26944822.pdf?src-supplier=Verical; ComponentLink3URL: https://datasheet.ciiva.com/26341/559479-da-01-en-tacc-c-6-0-mm-x-3-2-mm-x-2-6-mm-1-0-uf-26341816.pdf?src-supplier=Conrad; ComponentLink3Description: https://datasheet.ciiva.com/26341/559479-da-01-en-tacc-c-6-0-mm-x-3-2-mm-x-2-6-mm-1-0-uf-26341816.pdf?src-supplier=Conrad; ComponentLink4URL: https://datasheet.ciiva.com/7832/1680476-7832471.pdf?src-supplier=Element14; ComponentLink4Description: https://datasheet.ciiva.com/7832/1680476-7832471.pdf?src-supplier=Element14; ComponentLink5URL: https://datasheet.ciiva.com/7832/1680476-7832470.pdf?src-supplier=Element14; ComponentLink5Description: https://datasheet.ciiva.com/7832/1680476-7832470.pdf?src-supplier=Element14; ComponentLink6URL: https://datasheet.ciiva.com/7832/1680476-7832472.pdf?src-supplier=Element14; ComponentLink6Description: https://datasheet.ciiva.com/7832/1680476-7832472.pdf?src-supplier=Element14; ComponentLink7URL: https://datasheet.ciiva.com/264/taj-264149.pdf?src-supplier=Digi-Key; ComponentLink7Description: https://datasheet.ciiva.com/264/taj-264149.pdf?src-supplier=Digi-Key; ComponentLink8URL: https://datasheet.ciiva.com/264/taj-264148.pdf?src-supplier=Digi-Key; ComponentLink8Description: https://datasheet.ciiva.com/264/taj-264148.pdf?src-supplier=Digi-Key; ComponentLink9URL: https://datasheet.ciiva.com/264/taj-264150.pdf?src-supplier=Digi-Key; ComponentLink9Description: https://datasheet.ciiva.com/264/taj-264150.pdf?src-supplier=Digi-Key; ComponentLink10URL: https://datasheet.ciiva.com/12910/taj-27497-12910374.pdf?src-supplier=Mouser; ComponentLink10Description: https://datasheet.ciiva.com/12910/taj-27497-12910374.pdf?src-supplier=Mouser; ComponentLink11URL: https://datasheet.ciiva.com/14608/70001050-14608250.pdf?src-supplier=Allied+Electronics; ComponentLink11Description: https://datasheet.ciiva.com/14608/70001050-14608250.pdf?src-supplier=Allied+Electronics; ComponentLink12URL: https://datasheet.ciiva.com/14587/70001050-14587320.pdf?src-supplier=Allied+Electronics; ComponentLink12Description: https://datasheet.ciiva.com/14587/70001050-14587320.pdf?src-supplier=Allied+Electronics; ComponentLink13URL: https://datasheet.ciiva.com/3004/taj-3004470.pdf?src-supplier=Avnet; ComponentLink13Description: https://datasheet.ciiva.com/3004/taj-3004470.pdf?src-supplier=Avnet; ComponentLink14URL: https://datasheet.ciiva.com/16377/taj-16377070.pdf?src-supplier=Future+Electronics; ComponentLink14Description: https://datasheet.ciiva.com/16377/taj-16377070.pdf?src-supplier=Future+Electronics; ComponentLink15URL: https://datasheet.ciiva.com/16632/taj-16632614.pdf?src-supplier=Avnet+Europe; ComponentLink15Description: https://datasheet.ciiva.com/16632/taj-16632614.pdf?src-supplier=Avnet+Europe; ComponentLink16URL: https://datasheet.ciiva.com/16485/taj-16485995.pdf?src-supplier=Avnet+Asia; ComponentLink16Description: https://datasheet.ciiva.com/16485/taj-16485995.pdf?src-supplier=Avnet+Asia
footprint Capacitor/Tantalum  - SMD6032/C - AVX (C-6032 / AVX)
pins: 1, 2
text: +

## TAJC106K010RNJ
designator C?  Supplier Part Number 1: 1364551
Cap Tant Solid 10uF 10V C CASE 10% (6 X 3.2 X 2.6mm) SMD 6032-28 2.5 Ohm 125 C T/R; Manufacturer: Kyocera AVX; Manufacturer Part Number: TAJC106K010RNJ; Dielectric Material: Tantalum; ESR (Equivalent Series Resistance): 2.5R; Polarity: Polar; Dissipation Factor: 6%; Q Factor: 6; Supplier 1: RSComponents; RoHS: Yes; Category: Tantalum Capacitors; Stock 1: 2060; Pricing 1: 20=0.27500, 100=0.23400, 400=0.20600, 1000=0.17900 (GBP); Mount: Surface Mount,PCB; Case/Package: 2412; Case Code (Imperial): 2412; Case Code (Metric): 6032; Min Operating Temperature: -55°C; Max Operating Temperature: 125°C; Capacitance: 10uF; Tolerance: 10%; Voltage Rating: 10V; Voltage Rating (DC): 10V; Packaging: Tape and Reel; Package Quantity: 1; Termination: SMD/SMT; Voltage: 10V; Features: General Purpose; Series: TAJ; Construction: Flat; Length: 6mm; Width: 3.2mm; Height: 2.6mm; Depth: 3.2mm; Height - Seated (Max): 0.11inch; Lead Pitch: 2.9mm; Radiation Hardening: No; REACH SVHC: No SVHC; Lead Free: Lead Free; RoHS Compliant: Yes; ComponentLink1URL: https://datasheet.ciiva.com/263/taj-263625.pdf?src-supplier=Digi-Key; ComponentLink1Description: https://datasheet.ciiva.com/263/taj-263625.pdf?src-supplier=Digi-Key; ComponentLink2URL: https://datasheet.ciiva.com/263/taj-263626.pdf?src-supplier=Digi-Key; ComponentLink2Description: https://datasheet.ciiva.com/263/taj-263626.pdf?src-supplier=Digi-Key; ComponentLink3URL: https://datasheet.ciiva.com/263/taj-263627.pdf?src-supplier=Digi-Key; ComponentLink3Description: https://datasheet.ciiva.com/263/taj-263627.pdf?src-supplier=Digi-Key; ComponentLink4URL: https://datasheet.ciiva.com/28609/taj-28609005.pdf?src-supplier=Element14; ComponentLink4Description: https://datasheet.ciiva.com/28609/taj-28609005.pdf?src-supplier=Element14; ComponentLink5URL: https://datasheet.ciiva.com/7730/1680476-7730734.pdf?src-supplier=Element14; ComponentLink5Description: https://datasheet.ciiva.com/7730/1680476-7730734.pdf?src-supplier=Element14; ComponentLink6URL: https://datasheet.ciiva.com/7730/1680476-7730735.pdf?src-supplier=Element14; ComponentLink6Description: https://datasheet.ciiva.com/7730/1680476-7730735.pdf?src-supplier=Element14; ComponentLink7URL: https://datasheet.ciiva.com/12884/taj-27497-12884277.pdf?src-supplier=Mouser; ComponentLink7Description: https://datasheet.ciiva.com/12884/taj-27497-12884277.pdf?src-supplier=Mouser
footprint Capacitor/Tantalum  - SMD6032/C - AVX (C-6032 / AVX)
pins: 1, 2
text: +

## TAJC106K016RNJ
designator C?  Supplier Part Number 1: 1360262
钽电容 10uF ±10% 16V 2Ω C型6032; Manufacturer: Kyocera AVX; Manufacturer Part Number: TAJC106K016RNJ; Dielectric Material: Tantalum; ESR (Equivalent Series Resistance): 2R; Leakage Current: 1.6uA; Polarity: Polar; Dissipation Factor: 6%; Q Factor: 6; Supplier 1: RSComponents; RoHS: Yes; Category: Tantalum Capacitors; Stock 1: 1100; Pricing 1: 500=0.20600, 2500=0.19800, 5000=0.19200 (USD); Mount: Surface Mount,PCB; Case/Package: Molded; Number of Pins: 2; Case Code (Metric): 6032; Case Code (Imperial): 2412; Min Operating Temperature: -55°C; Max Operating Temperature: 125°C; Capacitance: 10uF; Tolerance: 10%; Package Quantity: 500; Voltage Rating: 16V; Packaging: Tape and Reel; Voltage Rating (DC): 16V; Termination: SMD/SMT; Voltage: 16V; Features: General Purpose; Series: TAJ; Length: 6mm; Width: 3.2mm; Height: 2.6mm; Depth: 3.2mm; Height - Seated (Max): 0.11inch; Radiation Hardening: No; RoHS Compliant: Yes; REACH SVHC: No SVHC; Lead Free: Lead Free; ComponentLink1URL: https://datasheet.ciiva.com/11793/0900766b80ccdc61-11793344.pdf?src-supplier=RSComponents; ComponentLink1Description: https://datasheet.ciiva.com/11793/0900766b80ccdc61-11793344.pdf?src-supplier=RSComponents; ComponentLink2URL: https://datasheet.ciiva.com/26341/559477-da-01-en-tacc-c-6-0-mm-x-3-2-mm-x-2-6-mm-10-uf-26341812.pdf?src-supplier=Conrad; ComponentLink2Description: https://datasheet.ciiva.com/26341/559477-da-01-en-tacc-c-6-0-mm-x-3-2-mm-x-2-6-mm-10-uf-26341812.pdf?src-supplier=Conrad; ComponentLink3URL: https://datasheet.ciiva.com/5937/taj-5937097.pdf?src-supplier=Farnell; ComponentLink3Description: https://datasheet.ciiva.com/5937/taj-5937097.pdf?src-supplier=Farnell; ComponentLink4URL: https://datasheet.ciiva.com/7730/taj-7730981.pdf?src-supplier=Element14; ComponentLink4Description: https://datasheet.ciiva.com/7730/taj-7730981.pdf?src-supplier=Element14; ComponentLink5URL: https://datasheet.ciiva.com/5936/13070-5936855.pdf?src-supplier=Farnell; ComponentLink5Description: https://datasheet.ciiva.com/5936/13070-5936855.pdf?src-supplier=Farnell; ComponentLink6URL: https://datasheet.ciiva.com/263/taj-263647.pdf?src-supplier=Digi-Key; ComponentLink6Description: https://datasheet.ciiva.com/263/taj-263647.pdf?src-supplier=Digi-Key; ComponentLink7URL: https://datasheet.ciiva.com/263/taj-263646.pdf?src-supplier=Digi-Key; ComponentLink7Description: https://datasheet.ciiva.com/263/taj-263646.pdf?src-supplier=Digi-Key; ComponentLink8URL: https://datasheet.ciiva.com/263/taj-263648.pdf?src-supplier=Digi-Key; ComponentLink8Description: https://datasheet.ciiva.com/263/taj-263648.pdf?src-supplier=Digi-Key; ComponentLink9URL: https://datasheet.ciiva.com/12911/taj-27497-12911160.pdf?src-supplier=Mouser; ComponentLink9Description: https://datasheet.ciiva.com/12911/taj-27497-12911160.pdf?src-supplier=Mouser; ComponentLink10URL: https://datasheet.ciiva.com/14605/70001050-14605654.pdf?src-supplier=Allied+Electronics; ComponentLink10Description: https://datasheet.ciiva.com/14605/70001050-14605654.pdf?src-supplier=Allied+Electronics; ComponentLink11URL: https://datasheet.ciiva.com/16492/taj-16492894.pdf?src-supplier=Future+Electronics; ComponentLink11Description: https://datasheet.ciiva.com/16492/taj-16492894.pdf?src-supplier=Future+Electronics; ComponentLink12URL: https://datasheet.ciiva.com/15163/getdatasheetpartid-120898-15163421.pdf?src-supplier=Verical; ComponentLink12Description: https://datasheet.ciiva.com/15163/getdatasheetpartid-120898-15163421.pdf?src-supplier=Verical; ComponentLink13URL: https://datasheet.ciiva.com/16632/taj-16632686.pdf?src-supplier=Avnet+Europe; ComponentLink13Description: https://datasheet.ciiva.com/16632/taj-16632686.pdf?src-supplier=Avnet+Europe
footprint Capacitor/Tantalum  - SMD6032/C - AVX (C-6032 / AVX)
pins: 1, 2
text: +

## TAJC106K020RNJ
designator C?  Supplier Part Number 1: 1360263
钽电容 10uF ±10% 20V 1.2Ω C型6032; Manufacturer: Kyocera AVX; Manufacturer Part Number: TAJC106K020RNJ; Dielectric Material: Tantalum; ESR (Equivalent Series Resistance): 1.2R; Leakage Current: 2uA; Dissipation Factor: 6%; Polarity: Polar; Q Factor: 6; Supplier 1: RSComponents; RoHS: Yes; Category: Tantalum Capacitors; Stock 1: 1; Pricing 1: 500=0.17500, 2500=0.16500 (USD); Mount: Surface Mount,PCB; Case/Package: Molded; Case Code (Metric): 6032; Case Code (Imperial): 2312; Min Operating Temperature: -55°C; Max Operating Temperature: 125°C; Capacitance: 10uF; Tolerance: 10%; Voltage Rating (DC): 20V; Packaging: Tape and Reel; Package Quantity: 1; Voltage Rating: 20V; Termination: SMD/SMT; Voltage: 20V; Features: General Purpose; Series: TAJ; Construction: Flat; Length: 6mm; Width: 0.126inch; Height: 2.6mm; Depth: 3.2mm; Height - Seated (Max): 0.11inch; Radiation Hardening: No; REACH SVHC: No SVHC; Lead Free: Lead Free; RoHS Compliant: Yes; ComponentLink1URL: https://datasheet.ciiva.com/11793/0900766b80ccdc61-11793521.pdf?src-supplier=RSComponents; ComponentLink1Description: https://datasheet.ciiva.com/11793/0900766b80ccdc61-11793521.pdf?src-supplier=RSComponents; ComponentLink2URL: https://datasheet.ciiva.com/18710/taj-eng-18710869.pdf?src-supplier=Distrelec; ComponentLink2Description: https://datasheet.ciiva.com/18710/taj-eng-18710869.pdf?src-supplier=Distrelec; ComponentLink3URL: https://datasheet.ciiva.com/7730/1680476-7730743.pdf?src-supplier=Element14; ComponentLink3Description: https://datasheet.ciiva.com/7730/1680476-7730743.pdf?src-supplier=Element14; ComponentLink4URL: https://datasheet.ciiva.com/263/taj-263638.pdf?src-supplier=Digi-Key; ComponentLink4Description: https://datasheet.ciiva.com/263/taj-263638.pdf?src-supplier=Digi-Key; ComponentLink5URL: https://datasheet.ciiva.com/263/taj-263637.pdf?src-supplier=Digi-Key; ComponentLink5Description: https://datasheet.ciiva.com/263/taj-263637.pdf?src-supplier=Digi-Key; ComponentLink6URL: https://datasheet.ciiva.com/263/taj-263639.pdf?src-supplier=Digi-Key; ComponentLink6Description: https://datasheet.ciiva.com/263/taj-263639.pdf?src-supplier=Digi-Key; ComponentLink7URL: https://datasheet.ciiva.com/7730/1680476-7730741.pdf?src-supplier=Element14; ComponentLink7Description: https://datasheet.ciiva.com/7730/1680476-7730741.pdf?src-supplier=Element14; ComponentLink8URL: https://datasheet.ciiva.com/7730/1680476-7730742.pdf?src-supplier=Element14; ComponentLink8Description: https://datasheet.ciiva.com/7730/1680476-7730742.pdf?src-supplier=Element14; ComponentLink9URL: https://datasheet.ciiva.com/12883/taj-27497-12883486.pdf?src-supplier=Mouser; ComponentLink9Description: https://datasheet.ciiva.com/12883/taj-27497-12883486.pdf?src-supplier=Mouser; ComponentLink10URL: https://datasheet.ciiva.com/3004/taj-3004472.pdf?src-supplier=Avnet; ComponentLink10Description: https://datasheet.ciiva.com/3004/taj-3004472.pdf?src-supplier=Avnet; ComponentLink11URL: https://datasheet.ciiva.com/16353/taj-16353070.pdf?src-supplier=Future+Electronics; ComponentLink11Description: https://datasheet.ciiva.com/16353/taj-16353070.pdf?src-supplier=Future+Electronics; ComponentLink12URL: https://datasheet.ciiva.com/15162/getdatasheetpartid-39964-15162988.pdf?src-supplier=Verical; ComponentLink12Description: https://datasheet.ciiva.com/15162/getdatasheetpartid-39964-15162988.pdf?src-supplier=Verical; ComponentLink13URL: https://datasheet.ciiva.com/16632/taj-16632687.pdf?src-supplier=Avnet+Europe; ComponentLink13Description: https://datasheet.ciiva.com/16632/taj-16632687.pdf?src-supplier=Avnet+Europe; ComponentLink14URL: https://datasheet.ciiva.com/11225/taj-11225997.pdf?src-supplier=Avnet; ComponentLink14Description: https://datasheet.ciiva.com/11225/taj-11225997.pdf?src-supplier=Avnet
footprint Capacitor/Tantalum  - SMD6032/C - AVX (C-6032 / AVX)
pins: 1, 2
text: +
